# Altium schematic symbol library Capacitor - Ceramic - Sumsung.SchLib: 1421 symbols (part 5 of 8) (continued)
## CL21C331FBANNNC (continued)
CAP CER 330PF 50V NP0 0805; Part Number: CL21C331FBANNNC; Manufacturer: Samsung Electro-Mechanics America, Inc.; TemperatureRange: -55C ~ 125C; TemperatureCoefficient: C0G, NP0; Tolerance: 1%; Value: 330pF; PartId: 6011; Supplier 1: Digi-Key; Supplier Part Number 1: 1276-2642-2-ND; ComponentLink1Description: Datasheet; ComponentLink1URL: http://media.digikey.com/pdf/Data%20Sheets/Samsung%20PDFs/CL21C331FBANNNC_Spec.pdf; ComponentLink2Description: Digi-Key listing; ComponentLink2URL: http://digikey.com/product-detail/en/CL21C331FBANNNC/1276-2642-2-ND/3888300; Voltage: 50V; Price: 0.0705; Type: -; Device Package: 0805 (2012 Metric)
footprint CAP 0805/2012
pins: 1, 2

## CL21C331GBANNNC
designator C?, comment 330pF
CAP CER 330PF 50V NP0 0805; Part Number: CL21C331GBANNNC; Manufacturer: Samsung Electro-Mechanics America, Inc.; TemperatureRange: -55C ~ 125C; TemperatureCoefficient: C0G, NP0; Tolerance: 2%; Value: 330pF; PartId: 5944; Supplier 1: Digi-Key; Supplier Part Number 1: 1276-2643-2-ND; ComponentLink1Description: Datasheet; ComponentLink1URL: http://www.samsungsem.com/kr/support/product-search/mlcc/CL21C331GBANNNC.jsp; ComponentLink2Description: Digi-Key listing; ComponentLink2URL: http://digikey.com/product-detail/en/CL21C331GBANNNC/1276-2643-2-ND/3888301; Voltage: 50V; Price: 0.0457; Type: -; Device Package: 0805 (2012 Metric)
footprint CAP 0805/2012
pins: 1, 2

## CL21C331JBANNNC
designator C?, comment 330pF
CAP CER 330PF 50V NP0 0805; Part Number: CL21C331JBANNNC; Manufacturer: Samsung Electro-Mechanics America, Inc.; TemperatureRange: -55C ~ 125C; TemperatureCoefficient: C0G, NP0; Tolerance: 5%; Value: 330pF; PartId: 14024; Supplier 1: Digi-Key; Supplier Part Number 1: 1276-1189-2-ND; ComponentLink1Description: Datasheet; ComponentLink1URL: http://www.samsungsem.com/kr/support/product-search/mlcc/CL21C331JBANNNC.jsp; ComponentLink2Description: Digi-Key Listing; ComponentLink2URL: https://www.digikey.com/product-detail/en/samsung-electro-mechanics-america-inc/CL21C331JBANNNC/1276-1189-2-ND/3886847; Voltage: 50V; Price: 0.0115; Device Package: 0805 (2012 Metric)
footprint CAP 0805/2012
pins: 1, 2

## CL21C331JCANNNC
designator C?, comment 330pF
CAP CER 330PF 100V NP0 0805; Part Number: CL21C331JCANNNC; Manufacturer: Samsung Electro-Mechanics America, Inc.; TemperatureRange: -55C ~ 125C; TemperatureCoefficient: C0G, NP0; Tolerance: 5%; Value: 330pF; PartId: 5887; Supplier 1: Digi-Key; Supplier Part Number 1: 1276-2646-2-ND; ComponentLink1Description: Datasheet; ComponentLink1URL: http://www.samsungsem.com/kr/support/product-search/mlcc/CL21C331JCANNNC.jsp; ComponentLink2Description: Digi-Key listing; ComponentLink2URL: http://digikey.com/product-detail/en/CL21C331JCANNNC/1276-2646-2-ND/3888304; Voltage: 100V; Price: 0.0322; Type: -; Device Package: 0805 (2012 Metric)
footprint CAP 0805/2012
pins: 1, 2

## CL21C332JAFNNNE
designator C?, comment 3300pF
CAP CER 3300PF 25V NP0 0805; Part Number: CL21C332JAFNNNE; Manufacturer: Samsung Electro-Mechanics America, Inc.; TemperatureRange: -55C ~ 125C; TemperatureCoefficient: C0G, NP0; Tolerance: 5%; Value: 3300pF; PartId: 5940; Supplier 1: Digi-Key; Supplier Part Number 1: 1276-2997-2-ND; ComponentLink1Description: Datasheet; ComponentLink1URL: http://www.samsungsem.com/kr/support/product-search/mlcc/CL21C332JAFNNNE.jsp; ComponentLink2Description: Digi-Key listing; ComponentLink2URL: http://digikey.com/product-detail/en/CL21C332JAFNNNE/1276-2997-2-ND/3888655; Voltage: 25V; Price: 0.0442; Type: -; Device Package: 0805 (2012 Metric)
footprint CAP 0805/2012
pins: 1, 2

## CL21C360JBANNNC
designator C?, comment 36pF
CAP CER 36PF 50V NP0 0805; Part Number: CL21C360JBANNNC; Manufacturer: Samsung Electro-Mechanics America, Inc.; TemperatureRange: -55C ~ 125C; TemperatureCoefficient: C0G, NP0; Tolerance: 5%; Value: 36pF; PartId: 14252; Supplier 1: Digi-Key; Supplier Part Number 1: 1276-2649-2-ND; ComponentLink1Description: Datasheet; ComponentLink1URL: http://www.samsungsem.com/kr/support/product-search/mlcc/CL21C360JBANNNC.jsp; ComponentLink2Description: Digi-Key Listing; ComponentLink2URL: https://www.digikey.com/product-detail/en/samsung-electro-mechanics-america-inc/CL21C360JBANNNC/1276-2649-2-ND/3888307; Voltage: 50V; Price: 0.0113; Device Package: 0805 (2012 Metric)
footprint CAP 0805/2012
pins: 1, 2

## CL21C361JBANNNC
designator C?, comment 360pF
CAP CER 360PF 50V NP0 0805; Part Number: CL21C361JBANNNC; Manufacturer: Samsung Electro-Mechanics America, Inc.; TemperatureRange: -55C ~ 125C; TemperatureCoefficient: C0G, NP0; Tolerance: 5%; Value: 360pF; PartId: 5888; Supplier 1: Digi-Key; Supplier Part Number 1: 1276-2650-2-ND; ComponentLink1Description: Datasheet; ComponentLink1URL: http://www.samsungsem.com/kr/support/product-search/mlcc/CL21C361JBANNNC.jsp; ComponentLink2Description: Digi-Key listing; ComponentLink2URL: http://digikey.com/product-detail/en/CL21C361JBANNNC/1276-2650-2-ND/3888308; Voltage: 50V; Price: 0.0328; Type: -; Device Package: 0805 (2012 Metric)
footprint CAP 0805/2012
pins: 1, 2

## CL21C390JBANNNC
designator C?, comment 39pF
CAP CER 39PF 50V NP0 0805; Part Number: CL21C390JBANNNC; Manufacturer: Samsung Electro-Mechanics America, Inc.; TemperatureRange: -55C ~ 125C; TemperatureCoefficient: C0G, NP0; Tolerance: 5%; Value: 39pF; PartId: 5750; Supplier 1: Digi-Key; Supplier Part Number 1: 1276-1769-2-ND; ComponentLink1Description: Datasheet; ComponentLink1URL: http://www.samsungsem.com/kr/support/product-search/mlcc/CL21C390JBANNNC.jsp; ComponentLink2Description: Digi-Key listing; ComponentLink2URL: http://digikey.com/product-detail/en/CL21C390JBANNNC/1276-1769-2-ND/3887427; Voltage: 50V; Price: 0.0163; Type: -; Device Package: 0805 (2012 Metric)
footprint CAP 0805/2012
pins: 1, 2

## CL21C392JAANNNC
designator C?, comment 3900pF
CAP CER 3900PF 25V NP0 0805; Part Number: CL21C392JAANNNC; Manufacturer: Samsung Electro-Mechanics America, Inc.; TemperatureRange: -55C ~ 125C; TemperatureCoefficient: C0G, NP0; Tolerance: 5%; Value: 3900pF; PartId: 5969; Supplier 1: Digi-Key; Supplier Part Number 1: 1276-2654-2-ND; ComponentLink1Description: Datasheet; ComponentLink1URL: http://www.samsungsem.com/kr/support/product-search/mlcc/CL21C392JAANNNC.jsp; ComponentLink2Description: Digi-Key listing; ComponentLink2URL: http://digikey.com/product-detail/en/CL21C392JAANNNC/1276-2654-2-ND/3888312; Voltage: 25V; Price: 0.0578; Type: -; Device Package: 0805 (2012 Metric)
footprint CAP 0805/2012
pins: 1, 2

## CL21C430JBANNNC
designator C?, comment 43pF
CAP CER 43PF 50V NP0 0805; Part Number: CL21C430JBANNNC; Manufacturer: Samsung Electro-Mechanics America, Inc.; TemperatureRange: -55C ~ 125C; TemperatureCoefficient: C0G, NP0; Tolerance: 5%; Value: 43pF; PartId: 5670; Supplier 1: Digi-Key; Supplier Part Number 1: 1276-2657-2-ND; ComponentLink1Description: Datasheet; ComponentLink1URL: http://www.samsungsem.com/kr/support/product-search/mlcc/CL21C430JBANNNC.jsp; ComponentLink2Description: Digi-Key listing; ComponentLink2URL: http://digikey.com/product-detail/en/CL21C430JBANNNC/1276-2657-2-ND/3888315; Voltage: 50V; Price: 0.0054; Type: -; Device Package: 0805 (2012 Metric)
footprint CAP 0805/2012
pins: 1, 2

## CL21C431JBANNNC
designator C?, comment 430pF
CAP CER 430PF 50V NP0 0805; Part Number: CL21C431JBANNNC; Manufacturer: Samsung Electro-Mechanics America, Inc.; TemperatureRange: -55C ~ 125C; TemperatureCoefficient: C0G, NP0; Tolerance: 5%; Value: 430pF; PartId: 5902; Supplier 1: Digi-Key; Supplier Part Number 1: 1276-2659-2-ND; ComponentLink1Description: Datasheet; ComponentLink1URL: http://www.samsungsem.com/kr/support/product-search/mlcc/CL21C431JBANNNC.jsp; ComponentLink2Description: Digi-Key listing; ComponentLink2URL: http://digikey.com/product-detail/en/CL21C431JBANNNC/1276-2659-2-ND/3888317; Voltage: 50V; Price: 0.0351; Type: -; Device Package: 0805 (2012 Metric)
footprint CAP 0805/2012
pins: 1, 2

## CL21C470JBANNNC
designator C?, comment 47pF
CAP CER 47PF 50V NP0 0805; Part Number: CL21C470JBANNNC; Manufacturer: Samsung Electro-Mechanics America, Inc.; TemperatureRange: -55C ~ 125C; TemperatureCoefficient: C0G, NP0; Tolerance: 5%; Value: 47pF; PartId: 5710; Supplier 1: Digi-Key; Supplier Part Number 1: 1276-1156-2-ND; ComponentLink1Description: Datasheet; ComponentLink1URL: http://www.samsungsem.com/kr/support/product-search/mlcc/CL21C470JBANNNC.jsp; ComponentLink2Description: Digi-Key listing; ComponentLink2URL: http://digikey.com/product-detail/en/CL21C470JBANNNC/1276-1156-2-ND/3886814; Voltage: 50V; Price: 0.0132; Type: -; Device Package: 0805 (2012 Metric)
footprint CAP 0805/2012
pins: 1, 2

## CL21C470JCANNNC
designator C?, comment 47pF
CAP CER 47PF 100V NP0 0805; Part Number: CL21C470JCANNNC; Manufacturer: Samsung Electro-Mechanics America, Inc.; TemperatureRange: -55C ~ 125C; TemperatureCoefficient: C0G, NP0; Tolerance: 5%; Value: 47pF; PartId: 5821; Supplier 1: Digi-Key; Supplier Part Number 1: 1276-2662-2-ND; ComponentLink1Description: Datasheet; ComponentLink1URL: http://www.samsungsem.com/kr/support/product-search/mlcc/CL21C470JCANNNC.jsp; ComponentLink2Description: Digi-Key listing; ComponentLink2URL: http://digikey.com/product-detail/en/CL21C470JCANNNC/1276-2662-2-ND/3888320; Voltage: 100V; Price: 0.0214; Type: -; Device Package: 0805 (2012 Metric)
footprint CAP 0805/2012
pins: 1, 2

## CL21C471JBANNNC
designator C?, comment 470pF
CAP CER 470PF 50V NP0 0805; Part Number: CL21C471JBANNNC; Manufacturer: Samsung Electro-Mechanics America, Inc.; TemperatureRange: -55C ~ 125C; TemperatureCoefficient: C0G, NP0; Tolerance: 5%; Value: 470pF; PartId: 13839; Supplier 1: Digi-Key; Supplier Part Number 1: 1276-1121-2-ND; ComponentLink1Description: Datasheet; ComponentLink1URL: http://www.samsungsem.com/kr/support/product-search/mlcc/CL21C471JBANNNC.jsp; ComponentLink2Description: Digi-Key Listing; ComponentLink2URL: https://www.digikey.com/product-detail/en/samsung-electro-mechanics-america-inc/CL21C471JBANNNC/1276-1121-2-ND/3886779; Voltage: 50V; Price: 0.0154; Device Package: 0805 (2012 Metric)
footprint CAP 0805/2012
pins: 1, 2

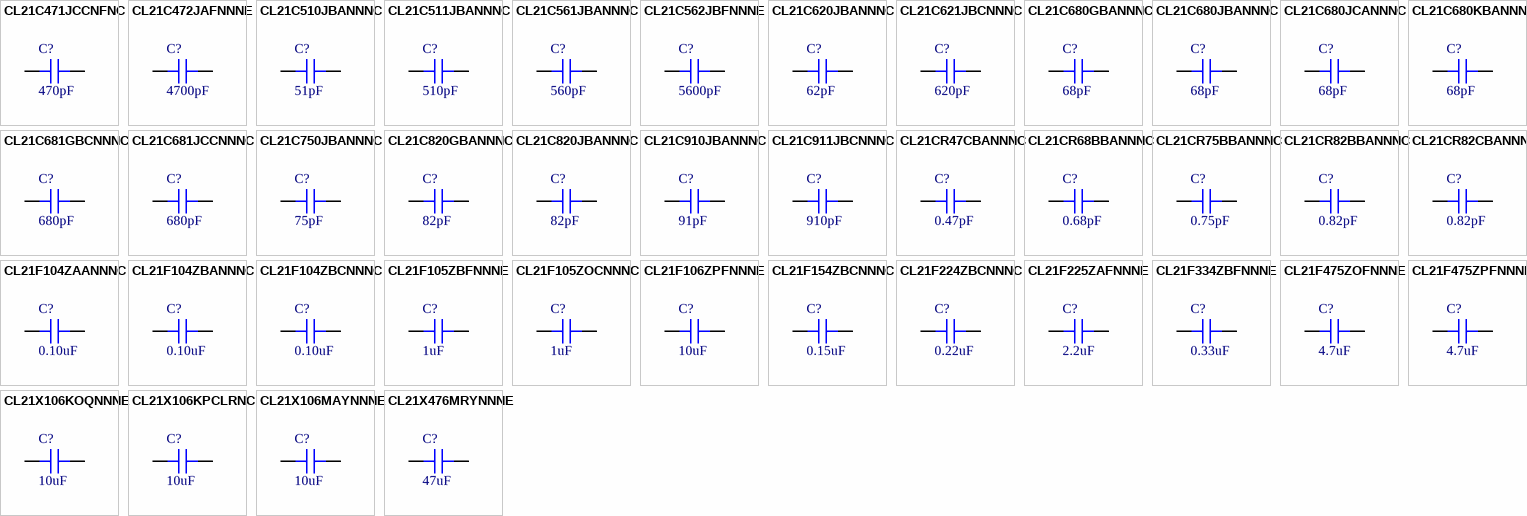
[diagram p23: symbols CL21C471JCCNFNC to CL21X476MRYNNNE]

## CL21C471JCCNFNC
designator C?, comment 470pF
CAP CER 470PF 100V NP0 0805; Part Number: CL21C471JCCNFNC; Manufacturer: Samsung Electro-Mechanics America, Inc.; TemperatureRange: -55C ~ 125C; TemperatureCoefficient: C0G, NP0; Tolerance: 5%; Value: 470pF; PartId: 5893; Supplier 1: Digi-Key; Supplier Part Number 1: 1276-2666-2-ND; ComponentLink1Description: Datasheet; ComponentLink1URL: http://www.samsungsem.com/kr/support/product-search/mlcc/CL21C471JCCNFNC.jsp; ComponentLink2Description: Digi-Key listing; ComponentLink2URL: http://digikey.com/product-detail/en/CL21C471JCCNFNC/1276-2666-2-ND/3888324; Voltage: 100V; Price: 0.0339; Type: -; Device Package: 0805 (2012 Metric)
footprint CAP 0805/2012
pins: 1, 2

## CL21C472JAFNNNE
designator C?, comment 4700pF
CAP CER 4700PF 25V NP0 0805; Part Number: CL21C472JAFNNNE; Manufacturer: Samsung Electro-Mechanics America, Inc.; TemperatureRange: -55C ~ 125C; TemperatureCoefficient: C0G, NP0; Tolerance: 5%; Value: 4700pF; PartId: 6016; Supplier 1: Digi-Key; Supplier Part Number 1: 1276-3001-2-ND; ComponentLink1Description: Datasheet; ComponentLink1URL: http://www.samsungsem.com/kr/support/product-search/mlcc/CL21C472JAFNNNE.jsp; ComponentLink2Description: Digi-Key listing; ComponentLink2URL: http://digikey.com/product-detail/en/CL21C472JAFNNNE/1276-3001-2-ND/3888659; Voltage: 25V; Price: 0.0712; Type: -; Device Package: 0805 (2012 Metric)
footprint CAP 0805/2012
pins: 1, 2

## CL21C510JBANNNC
designator C?, comment 51pF
CAP CER 51PF 50V NP0 0805; Part Number: CL21C510JBANNNC; Manufacturer: Samsung Electro-Mechanics America, Inc.; TemperatureRange: -55C ~ 125C; TemperatureCoefficient: C0G, NP0; Tolerance: 5%; Value: 51pF; PartId: 5764; Supplier 1: Digi-Key; Supplier Part Number 1: 1276-2670-2-ND; ComponentLink1Description: Datasheet; ComponentLink1URL: http://www.samsungsem.com/kr/support/product-search/mlcc/CL21C510JBANNNC.jsp; ComponentLink2Description: Digi-Key listing; ComponentLink2URL: http://digikey.com/product-detail/en/CL21C510JBANNNC/1276-2670-2-ND/3888328; Voltage: 50V; Price: 0.0163; Type: -; Device Package: 0805 (2012 Metric)
footprint CAP 0805/2012
pins: 1, 2

## CL21C511JBANNNC
designator C?, comment 510pF
CAP CER 510PF 50V NP0 0805; Part Number: CL21C511JBANNNC; Manufacturer: Samsung Electro-Mechanics America, Inc.; TemperatureRange: -55C ~ 125C; TemperatureCoefficient: C0G, NP0; Tolerance: 5%; Value: 510pF; PartId: 5924; Supplier 1: Digi-Key; Supplier Part Number 1: 1276-2671-2-ND; ComponentLink1Description: Datasheet; ComponentLink1URL: http://www.samsungsem.com/kr/support/product-search/mlcc/CL21C511JBANNNC.jsp; ComponentLink2Description: Digi-Key listing; ComponentLink2URL: http://digikey.com/product-detail/en/CL21C511JBANNNC/1276-2671-2-ND/3888329; Voltage: 50V; Price: 0.0406; Type: -; Device Package: 0805 (2012 Metric)
footprint CAP 0805/2012
pins: 1, 2

## CL21C561JBANNNC
designator C?, comment 560pF
CAP CER 560PF 50V NP0 0805; Part Number: CL21C561JBANNNC; Manufacturer: Samsung Electro-Mechanics America, Inc.; TemperatureRange: -55C ~ 125C; TemperatureCoefficient: C0G, NP0; Tolerance: 5%; Value: 560pF; PartId: 5869; Supplier 1: Digi-Key; Supplier Part Number 1: 1276-1834-2-ND; ComponentLink1Description: Datasheet; ComponentLink1URL: http://www.samsungsem.com/kr/support/product-search/mlcc/CL21C561JBANNNC.jsp; ComponentLink2Description: Digi-Key listing; ComponentLink2URL: http://digikey.com/product-detail/en/CL21C561JBANNNC/1276-1834-2-ND/3887492; Voltage: 50V; Price: 0.0289; Type: -; Device Package: 0805 (2012 Metric)
footprint CAP 0805/2012
pins: 1, 2

## CL21C562JBFNNNE
designator C?, comment 5600pF
CAP CER 5600PF 50V NP0 0805; Part Number: CL21C562JBFNNNE; Manufacturer: Samsung Electro-Mechanics America, Inc.; TemperatureRange: -55C ~ 125C; TemperatureCoefficient: C0G, NP0; Tolerance: 5%; Value: 5600pF; PartId: 6001; Supplier 1: Digi-Key; Supplier Part Number 1: 1276-3006-2-ND; ComponentLink1Description: Datasheet; ComponentLink1URL: http://www.samsungsem.com/kr/support/product-search/mlcc/CL21C562JBFNNNE.jsp; ComponentLink2Description: Digi-Key listing; ComponentLink2URL: http://digikey.com/product-detail/en/CL21C562JBFNNNE/1276-3006-2-ND/3888664; Voltage: 50V; Price: 0.0672; Type: -; Device Package: 0805 (2012 Metric)
footprint CAP 0805/2012
pins: 1, 2

## CL21C620JBANNNC
designator C?, comment 62pF
CAP CER 62PF 50V NP0 0805; Part Number: CL21C620JBANNNC; Manufacturer: Samsung Electro-Mechanics America, Inc.; TemperatureRange: -55C ~ 125C; TemperatureCoefficient: C0G, NP0; Tolerance: 5%; Value: 62pF; PartId: 5756; Supplier 1: Digi-Key; Supplier Part Number 1: 1276-1305-2-ND; ComponentLink1Description: Datasheet; ComponentLink1URL: http://www.samsungsem.com/kr/support/product-search/mlcc/CL21C620JBANNNC.jsp; ComponentLink2Description: Digi-Key listing; ComponentLink2URL: http://digikey.com/product-detail/en/CL21C620JBANNNC/1276-1305-2-ND/3886963; Voltage: 50V; Price: 0.0163; Type: -; Device Package: 0805 (2012 Metric)
footprint CAP 0805/2012
pins: 1, 2

## CL21C621JBCNNNC
designator C?, comment 620pF
CAP CER 620PF 50V NP0 0805; Part Number: CL21C621JBCNNNC; Manufacturer: Samsung Electro-Mechanics America, Inc.; TemperatureRange: -55C ~ 125C; TemperatureCoefficient: C0G, NP0; Tolerance: 5%; Value: 620pF; PartId: 5721; Supplier 1: Digi-Key; Supplier Part Number 1: 1276-2677-2-ND; ComponentLink1Description: Datasheet; ComponentLink1URL: http://www.samsungsem.com/kr/support/product-search/mlcc/CL21C621JBCNNNC.jsp; ComponentLink2Description: Digi-Key listing; ComponentLink2URL: http://digikey.com/product-detail/en/CL21C621JBCNNNC/1276-2677-2-ND/3888335; Voltage: 50V; Price: 0.0139; Type: -; Device Package: 0805 (2012 Metric)
footprint CAP 0805/2012
pins: 1, 2

## CL21C680GBANNNC
designator C?, comment 68pF
CAP CER 68PF 50V NP0 0805; Part Number: CL21C680GBANNNC; Manufacturer: Samsung Electro-Mechanics America, Inc.; TemperatureRange: -55C ~ 125C; TemperatureCoefficient: C0G, NP0; Tolerance: 2%; Value: 68pF; PartId: 5960; Supplier 1: Digi-Key; Supplier Part Number 1: 1276-2678-2-ND; ComponentLink1Description: Datasheet; ComponentLink1URL: http://www.samsungsem.com/kr/support/product-search/mlcc/CL21C680GBANNNC.jsp; ComponentLink2Description: Digi-Key listing; ComponentLink2URL: http://digikey.com/product-detail/en/CL21C680GBANNNC/1276-2678-2-ND/3888336; Voltage: 50V; Price: 0.0567; Type: -; Device Package: 0805 (2012 Metric)
footprint CAP 0805/2012
pins: 1, 2

## CL21C680JBANNNC
designator C?, comment 68pF
CAP CER 68PF 50V NP0 0805; Part Number: CL21C680JBANNNC; Manufacturer: Samsung Electro-Mechanics America, Inc.; TemperatureRange: -55C ~ 125C; TemperatureCoefficient: C0G, NP0; Tolerance: 5%; Value: 68pF; PartId: 5737; Supplier 1: Digi-Key; Supplier Part Number 1: 1276-1136-2-ND; ComponentLink1Description: Datasheet; ComponentLink1URL: http://www.samsungsem.com/kr/support/product-search/mlcc/CL21C680JBANNNC.jsp; ComponentLink2Description: Digi-Key listing; ComponentLink2URL: http://digikey.com/product-detail/en/CL21C680JBANNNC/1276-1136-2-ND/3886794; Voltage: 50V; Price: 0.0153; Type: -; Device Package: 0805 (2012 Metric)
footprint CAP 0805/2012
pins: 1, 2

## CL21C680JCANNNC
designator C?, comment 68pF
CAP CER 68PF 100V NP0 0805; Part Number: CL21C680JCANNNC; Manufacturer: Samsung Electro-Mechanics America, Inc.; TemperatureRange: -55C ~ 125C; TemperatureCoefficient: C0G, NP0; Tolerance: 5%; Value: 68pF; PartId: 5849; Supplier 1: Digi-Key; Supplier Part Number 1: 1276-2681-2-ND; ComponentLink1Description: Datasheet; ComponentLink1URL: http://www.samsungsem.com/kr/support/product-search/mlcc/CL21C680JCANNNC.jsp; ComponentLink2Description: Digi-Key listing; ComponentLink2URL: http://digikey.com/product-detail/en/CL21C680JCANNNC/1276-2681-2-ND/3888339; Voltage: 100V; Price: 0.0245; Type: -; Device Package: 0805 (2012 Metric)
footprint CAP 0805/2012
pins: 1, 2

## CL21C680KBANNNC
designator C?, comment 68pF
CAP CER 68PF 50V NP0 0805; Part Number: CL21C680KBANNNC; Manufacturer: Samsung Electro-Mechanics America, Inc.; TemperatureRange: -55C ~ 125C; TemperatureCoefficient: C0G, NP0; Tolerance: 10%; Value: 68pF; PartId: 5779; Supplier 1: Digi-Key; Supplier Part Number 1: 1276-2682-2-ND; ComponentLink1Description: Datasheet; ComponentLink1URL: http://www.samsungsem.com/kr/support/product-search/mlcc/CL21C680KBANNNC.jsp; ComponentLink2Description: Digi-Key listing; ComponentLink2URL: http://digikey.com/product-detail/en/CL21C680KBANNNC/1276-2682-2-ND/3888340; Voltage: 50V; Price: 0.0165; Type: -; Device Package: 0805 (2012 Metric)
footprint CAP 0805/2012
pins: 1, 2

## CL21C681GBCNNNC
designator C?, comment 680pF
CAP CER 680PF 50V NP0 0805; Part Number: CL21C681GBCNNNC; Manufacturer: Samsung Electro-Mechanics America, Inc.; TemperatureRange: -55C ~ 125C; TemperatureCoefficient: C0G, NP0; Tolerance: 2%; Value: 680pF; PartId: 6098; Supplier 1: Digi-Key; Supplier Part Number 1: 1276-2683-2-ND; ComponentLink1Description: Datasheet; ComponentLink1URL: http://www.samsungsem.com/kr/support/product-search/mlcc/CL21C681GBCNNNC.jsp; ComponentLink2Description: Digi-Key listing; ComponentLink2URL: http://digikey.com/product-detail/en/CL21C681GBCNNNC/1276-2683-2-ND/3888341; Voltage: 50V; Price: 0.1236; Type: -; Device Package: 0805 (2012 Metric)
footprint CAP 0805/2012
pins: 1, 2

## CL21C681JCCNNNC
designator C?, comment 680pF
CAP CER 680PF 100V NP0 0805; Part Number: CL21C681JCCNNNC; Manufacturer: Samsung Electro-Mechanics America, Inc.; TemperatureRange: -55C ~ 125C; TemperatureCoefficient: C0G, NP0; Tolerance: 5%; Value: 680pF; PartId: 5942; Supplier 1: Digi-Key; Supplier Part Number 1: 1276-1835-2-ND; ComponentLink1Description: Datasheet; ComponentLink1URL: http://www.samsungsem.com/kr/support/product-search/mlcc/CL21C681JCCNNNC.jsp; ComponentLink2Description: Digi-Key listing; ComponentLink2URL: http://digikey.com/product-detail/en/CL21C681JCCNNNC/1276-1835-2-ND/3887493; Voltage: 100V; Price: 0.0457; Type: -; Device Package: 0805 (2012 Metric)
footprint CAP 0805/2012
pins: 1, 2

## CL21C750JBANNNC
designator C?, comment 75pF
CAP CER 75PF 50V NP0 0805; Part Number: CL21C750JBANNNC; Manufacturer: Samsung Electro-Mechanics America, Inc.; TemperatureRange: -55C ~ 125C; TemperatureCoefficient: C0G, NP0; Tolerance: 5%; Value: 75pF; PartId: 5765; Supplier 1: Digi-Key; Supplier Part Number 1: 1276-2690-2-ND; ComponentLink1Description: Datasheet; ComponentLink1URL: http://www.samsungsem.com/kr/support/product-search/mlcc/CL21C750JBANNNC.jsp; ComponentLink2Description: Digi-Key listing; ComponentLink2URL: http://digikey.com/product-detail/en/CL21C750JBANNNC/1276-2690-2-ND/3888348; Voltage: 50V; Price: 0.0163; Type: -; Device Package: 0805 (2012 Metric)
footprint CAP 0805/2012
pins: 1, 2

## CL21C820GBANNNC
designator C?, comment 82pF
CAP CER 82PF 50V NP0 0805; Part Number: CL21C820GBANNNC; Manufacturer: Samsung Electro-Mechanics America, Inc.; TemperatureRange: -55C ~ 125C; TemperatureCoefficient: C0G, NP0; Tolerance: 2%; Value: 82pF; PartId: 5999; Supplier 1: Digi-Key; Supplier Part Number 1: 1276-2694-2-ND; ComponentLink1Description: Datasheet; ComponentLink1URL: http://www.samsungsem.com/kr/support/product-search/mlcc/CL21C820GBANNNC.jsp; ComponentLink2Description: Digi-Key listing; ComponentLink2URL: http://digikey.com/product-detail/en/CL21C820GBANNNC/1276-2694-2-ND/3888352; Voltage: 50V; Price: 0.067; Type: -; Device Package: 0805 (2012 Metric)
footprint CAP 0805/2012
pins: 1, 2

## CL21C820JBANNNC
designator C?, comment 82pF
CAP CER 82PF 50V NP0 0805; Part Number: CL21C820JBANNNC; Manufacturer: Samsung Electro-Mechanics America, Inc.; TemperatureRange: -55C ~ 125C; TemperatureCoefficient: C0G, NP0; Tolerance: 5%; Value: 82pF; PartId: 5749; Supplier 1: Digi-Key; Supplier Part Number 1: 1276-1802-2-ND; ComponentLink1Description: Datasheet; ComponentLink1URL: http://www.samsungsem.com/kr/support/product-search/mlcc/CL21C820JBANNNC.jsp; ComponentLink2Description: Digi-Key listing; ComponentLink2URL: http://digikey.com/product-detail/en/CL21C820JBANNNC/1276-1802-2-ND/3887460; Voltage: 50V; Price: 0.0163; Type: -; Device Package: 0805 (2012 Metric)
footprint CAP 0805/2012
pins: 1, 2

## CL21C910JBANNNC
designator C?, comment 91pF
CAP CER 91PF 50V NP0 0805; Part Number: CL21C910JBANNNC; Manufacturer: Samsung Electro-Mechanics America, Inc.; TemperatureRange: -55C ~ 125C; TemperatureCoefficient: C0G, NP0; Tolerance: 5%; Value: 91pF; PartId: 5760; Supplier 1: Digi-Key; Supplier Part Number 1: 1276-1836-2-ND; ComponentLink1Description: Datasheet; ComponentLink1URL: http://www.samsungsem.com/kr/support/product-search/mlcc/CL21C910JBANNNC.jsp; ComponentLink2Description: Digi-Key listing; ComponentLink2URL: http://digikey.com/product-detail/en/CL21C910JBANNNC/1276-1836-2-ND/3887494; Voltage: 50V; Price: 0.0163; Type: -; Device Package: 0805 (2012 Metric)
footprint CAP 0805/2012
pins: 1, 2

## CL21C911JBCNNNC
designator C?, comment 910pF
CAP CER 910PF 50V NP0 0805; Part Number: CL21C911JBCNNNC; Manufacturer: Samsung Electro-Mechanics America, Inc.; TemperatureRange: -55C ~ 125C; TemperatureCoefficient: C0G, NP0; Tolerance: 5%; Value: 910pF; PartId: 5936; Supplier 1: Digi-Key; Supplier Part Number 1: 1276-2698-2-ND; ComponentLink1Description: Datasheet; ComponentLink1URL: http://www.samsungsem.com/kr/support/product-search/mlcc/CL21C911JBCNNNC.jsp; ComponentLink2Description: Digi-Key listing; ComponentLink2URL: http://digikey.com/product-detail/en/CL21C911JBCNNNC/1276-2698-2-ND/3888356; Voltage: 50V; Price: 0.0435; Type: -; Device Package: 0805 (2012 Metric)
footprint CAP 0805/2012
pins: 1, 2

## CL21CR47CBANNNC
designator C?, comment 0.47pF
CAP CER 0.47PF 50V NP0 0805; Part Number: CL21CR47CBANNNC; Manufacturer: Samsung Electro-Mechanics America, Inc.; TemperatureRange: -55C ~ 125C; TemperatureCoefficient: C0G, NP0; Tolerance: 0.25pF; Value: 0.47pF; PartId: 5676; Supplier 1: Digi-Key; Supplier Part Number 1: 1276-2700-2-ND; ComponentLink1Description: Datasheet; ComponentLink1URL: http://media.digikey.com/pdf/Data%20Sheets/Samsung%20PDFs/CL21CR47CBANNNC_Spec.pdf; ComponentLink2Description: Digi-Key listing; ComponentLink2URL: http://digikey.com/product-detail/en/CL21CR47CBANNNC/1276-2700-2-ND/3888358; Voltage: 50V; Price: 0.0054; Type: -; Device Package: 0805 (2012 Metric)
footprint CAP 0805/2012
pins: 1, 2

## CL21CR68BBANNNC
designator C?, comment 0.68pF
CAP CER 0.68PF 50V NP0 0805; Part Number: CL21CR68BBANNNC; Manufacturer: Samsung Electro-Mechanics America, Inc.; TemperatureRange: -55C ~ 125C; TemperatureCoefficient: C0G, NP0; Tolerance: 0.1pF; Value: 0.68pF; PartId: 5692; Supplier 1: Digi-Key; Supplier Part Number 1: 1276-2701-2-ND; ComponentLink1Description: Datasheet; ComponentLink1URL: http://media.digikey.com/pdf/Data%20Sheets/Samsung%20PDFs/CL21CR68BBANNNC_Spec.pdf; ComponentLink2Description: Digi-Key listing; ComponentLink2URL: http://digikey.com/product-detail/en/CL21CR68BBANNNC/1276-2701-2-ND/3888359; Voltage: 50V; Price: 0.0078; Type: -; Device Package: 0805 (2012 Metric)
footprint CAP 0805/2012
pins: 1, 2

## CL21CR75BBANNNC
designator C?, comment 0.75pF
CAP CER 0.75PF 50V NP0 0805; Part Number: CL21CR75BBANNNC; Manufacturer: Samsung Electro-Mechanics America, Inc.; TemperatureRange: -55C ~ 125C; TemperatureCoefficient: C0G, NP0; Tolerance: 0.1pF; Value: 0.75pF; PartId: 5690; Supplier 1: Digi-Key; Supplier Part Number 1: 1276-2702-2-ND; ComponentLink1Description: Datasheet; ComponentLink1URL: http://media.digikey.com/pdf/Data%20Sheets/Samsung%20PDFs/CL21CR75BBANNNC_Spec.pdf; ComponentLink2Description: Digi-Key listing; ComponentLink2URL: http://digikey.com/product-detail/en/CL21CR75BBANNNC/1276-2702-2-ND/3888360; Voltage: 50V; Price: 0.0073; Type: -; Device Package: 0805 (2012 Metric)
footprint CAP 0805/2012
pins: 1, 2

## CL21CR82BBANNNC
designator C?, comment 0.82pF
CAP CER 0.82PF 50V NP0 0805; Part Number: CL21CR82BBANNNC; Manufacturer: Samsung Electro-Mechanics America, Inc.; TemperatureRange: -55C ~ 125C; TemperatureCoefficient: C0G, NP0; Tolerance: 0.1pF; Value: 0.82pF; PartId: 5691; Supplier 1: Digi-Key; Supplier Part Number 1: 1276-2703-2-ND; ComponentLink1Description: Datasheet; ComponentLink1URL: http://media.digikey.com/pdf/Data%20Sheets/Samsung%20PDFs/CL21CR82BBANNNC_Spec.pdf; ComponentLink2Description: Digi-Key listing; ComponentLink2URL: http://digikey.com/product-detail/en/CL21CR82BBANNNC/1276-2703-2-ND/3888361; Voltage: 50V; Price: 0.0075; Type: -; Device Package: 0805 (2012 Metric)
footprint CAP 0805/2012
pins: 1, 2

## CL21CR82CBANNNC
designator C?, comment 0.82pF
CAP CER 0.82PF 50V NP0 0805; Part Number: CL21CR82CBANNNC; Manufacturer: Samsung Electro-Mechanics America, Inc.; TemperatureRange: -55C ~ 125C; TemperatureCoefficient: C0G, NP0; Tolerance: 0.25pF; Value: 0.82pF; PartId: 5680; Supplier 1: Digi-Key; Supplier Part Number 1: 1276-2704-2-ND; ComponentLink1Description: Datasheet; ComponentLink1URL: http://media.digikey.com/pdf/Data%20Sheets/Samsung%20PDFs/CL21CR82CBANNNC_Spec.pdf; ComponentLink2Description: Digi-Key listing; ComponentLink2URL: http://digikey.com/product-detail/en/CL21CR82CBANNNC/1276-2704-2-ND/3888362; Voltage: 50V; Price: 0.0058; Type: -; Device Package: 0805 (2012 Metric)
footprint CAP 0805/2012
pins: 1, 2

## CL21F104ZAANNNC
designator C?, comment 0.10uF
CAP CER 0.1UF 25V Y5V 0805; Part Number: CL21F104ZAANNNC; Manufacturer: Samsung Electro-Mechanics America, Inc.; TemperatureRange: -30C ~ 85C; TemperatureCoefficient: Y5V (F); Tolerance: -20%, +80%; Value: 0.10uF; PartId: 13999; Supplier 1: Digi-Key; Supplier Part Number 1: 1276-1286-2-ND; ComponentLink1Description: Datasheet; ComponentLink1URL: http://www.samsungsem.com/kr/support/product-search/mlcc/CL21F104ZAANNNC.jsp; ComponentLink2Description: Digi-Key Listing; ComponentLink2URL: https://www.digikey.com/product-detail/en/samsung-electro-mechanics-america-inc/CL21F104ZAANNNC/1276-1286-2-ND/3886944; Voltage: 25V; Price: 0.006; Device Package: 0805 (2012 Metric)
footprint CAP 0805/2012
pins: 1, 2

## CL21F104ZBANNNC
designator C?, comment 0.10uF
CAP CER 0.1UF 50V Y5V 0805; Part Number: CL21F104ZBANNNC; Manufacturer: Samsung Electro-Mechanics America, Inc.; TemperatureRange: -30C ~ 85C; TemperatureCoefficient: Y5V (F); Tolerance: -20%, +80%; Value: 0.10uF; PartId: 14000; Supplier 1: Digi-Key; Supplier Part Number 1: 1276-1114-2-ND; ComponentLink1Description: Datasheet; ComponentLink1URL: http://www.samsungsem.com/kr/support/product-search/mlcc/CL21F104ZBANNNC.jsp; ComponentLink2Description: Digi-Key Listing; ComponentLink2URL: https://www.digikey.com/product-detail/en/samsung-electro-mechanics-america-inc/CL21F104ZBANNNC/1276-1114-2-ND/3886772; Voltage: 50V; Price: 0.006; Device Package: 0805 (2012 Metric)
footprint CAP 0805/2012
pins: 1, 2

## CL21F104ZBCNNNC
designator C?, comment 0.10uF
CAP CER 0.1UF 50V Y5V 0805; Part Number: CL21F104ZBCNNNC; Manufacturer: Samsung Electro-Mechanics America, Inc.; TemperatureRange: -30C ~ 85C; TemperatureCoefficient: Y5V (F); Tolerance: -20%, +80%; Value: 0.10uF; PartId: 13707; Supplier 1: Digi-Key; Supplier Part Number 1: 1276-1007-2-ND; ComponentLink1Description: Datasheet; ComponentLink1URL: http://www.samsungsem.com/kr/support/product-search/mlcc/CL21F104ZBCNNNC.jsp; ComponentLink2Description: Digi-Key Listing; ComponentLink2URL: https://www.digikey.com/product-detail/en/samsung-electro-mechanics-america-inc/CL21F104ZBCNNNC/1276-1007-2-ND/3886665; Voltage: 50V; Price: 0.006; Device Package: 0805 (2012 Metric)
footprint CAP 0805/2012
pins: 1, 2

## CL21F105ZBFNNNE
designator C?, comment 1uF
CAP CER 1UF 50V Y5V 0805; Part Number: CL21F105ZBFNNNE; Manufacturer: Samsung Electro-Mechanics America, Inc.; TemperatureRange: -30C ~ 85C; TemperatureCoefficient: Y5V (F); Tolerance: -20%, +80%; Value: 1uF; PartId: 13797; Supplier 1: Digi-Key; Supplier Part Number 1: 1276-3010-2-ND; ComponentLink1Description: Datasheet; ComponentLink1URL: http://www.samsungsem.com/kr/support/product-search/mlcc/CL21F105ZBFNNNE.jsp; ComponentLink2Description: Digi-Key Listing; ComponentLink2URL: https://www.digikey.com/product-detail/en/samsung-electro-mechanics-america-inc/CL21F105ZBFNNNE/1276-3010-2-ND/3888668; Voltage: 50V; Price: 0.0172; Device Package: 0805 (2012 Metric)
footprint CAP 0805/2012
pins: 1, 2

## CL21F105ZOCNNNC
designator C?, comment 1uF
CAP CER 1UF 16V Y5V 0805; Part Number: CL21F105ZOCNNNC; Manufacturer: Samsung Electro-Mechanics America, Inc.; TemperatureRange: -30C ~ 85C; TemperatureCoefficient: Y5V (F); Tolerance: -20%, +80%; Value: 1uF; PartId: 14027; Supplier 1: Digi-Key; Supplier Part Number 1: 1276-1246-2-ND; ComponentLink1Description: Datasheet; ComponentLink1URL: http://www.samsungsem.com/kr/support/product-search/mlcc/CL21F105ZOCNNNC.jsp; ComponentLink2Description: Digi-Key Listing; ComponentLink2URL: https://www.digikey.com/product-detail/en/samsung-electro-mechanics-america-inc/CL21F105ZOCNNNC/1276-1246-2-ND/3886904; Voltage: 16V; Price: 0.0082; Device Package: 0805 (2012 Metric)
footprint CAP 0805/2012
pins: 1, 2

## CL21F106ZPFNNNE
designator C?, comment 10uF
CAP CER 10UF 10V Y5V 0805; Part Number: CL21F106ZPFNNNE; Manufacturer: Samsung Electro-Mechanics America, Inc.; TemperatureRange: -30C ~ 85C; TemperatureCoefficient: Y5V (F); Tolerance: -20%, +80%; Value: 10uF; PartId: 13911; Supplier 1: Digi-Key; Supplier Part Number 1: 1276-3012-2-ND; ComponentLink1Description: Datasheet; ComponentLink1URL: http://www.samsungsem.com/kr/support/product-search/mlcc/CL21F106ZPFNNNE.jsp; ComponentLink2Description: Digi-Key Listing; ComponentLink2URL: https://www.digikey.com/product-detail/en/samsung-electro-mechanics-america-inc/CL21F106ZPFNNNE/1276-3012-2-ND/3888670; Voltage: 10V; Price: 0.0263; Device Package: 0805 (2012 Metric)
footprint CAP 0805/2012
pins: 1, 2

## CL21F154ZBCNNNC
designator C?, comment 0.15uF
CAP CER 0.15UF 50V Y5V 0805; Part Number: CL21F154ZBCNNNC; Manufacturer: Samsung Electro-Mechanics America, Inc.; TemperatureRange: -30C ~ 85C; TemperatureCoefficient: Y5V (F); Tolerance: -20%, +80%; Value: 0.15uF; PartId: 14028; Supplier 1: Digi-Key; Supplier Part Number 1: 1276-2708-2-ND; ComponentLink1Description: Datasheet; ComponentLink1URL: http://www.samsungsem.com/kr/support/product-search/mlcc/CL21F154ZBCNNNC.jsp; ComponentLink2Description: Digi-Key Listing; ComponentLink2URL: https://www.digikey.com/product-detail/en/samsung-electro-mechanics-america-inc/CL21F154ZBCNNNC/1276-2708-2-ND/3888366; Voltage: 50V; Price: 0.0042; Device Package: 0805 (2012 Metric)
footprint CAP 0805/2012
pins: 1, 2

## CL21F224ZBCNNNC
designator C?, comment 0.22uF
CAP CER 0.22UF 50V Y5V 0805; Part Number: CL21F224ZBCNNNC; Manufacturer: Samsung Electro-Mechanics America, Inc.; TemperatureRange: -30C ~ 85C; TemperatureCoefficient: Y5V (F); Tolerance: -20%, +80%; Value: 0.22uF; PartId: 14055; Supplier 1: Digi-Key; Supplier Part Number 1: 1276-2711-2-ND; ComponentLink1Description: Datasheet; ComponentLink1URL: http://www.samsungsem.com/kr/support/product-search/mlcc/CL21F224ZBCNNNC.jsp; ComponentLink2Description: Digi-Key Listing; ComponentLink2URL: https://www.digikey.com/product-detail/en/samsung-electro-mechanics-america-inc/CL21F224ZBCNNNC/1276-2711-2-ND/3888369; Voltage: 50V; Price: 0.0172; Device Package: 0805 (2012 Metric)
footprint CAP 0805/2012
pins: 1, 2

## CL21F225ZAFNNNE
designator C?, comment 2.2uF
CAP CER 2.2UF 25V Y5V 0805; Part Number: CL21F225ZAFNNNE; Manufacturer: Samsung Electro-Mechanics America, Inc.; TemperatureRange: -30C ~ 85C; TemperatureCoefficient: Y5V (F); Tolerance: -20%, +80%; Value: 2.2uF; PartId: 14054; Supplier 1: Digi-Key; Supplier Part Number 1: 1276-2874-2-ND; ComponentLink1Description: Datasheet; ComponentLink1URL: http://www.samsungsem.com/kr/support/product-search/mlcc/CL21F225ZAFNNNE.jsp; ComponentLink2Description: Digi-Key Listing; ComponentLink2URL: https://www.digikey.com/product-detail/en/samsung-electro-mechanics-america-inc/CL21F225ZAFNNNE/1276-2874-2-ND/3888532; Voltage: 25V; Price: 0.0205; Device Package: 0805 (2012 Metric)
footprint CAP 0805/2012
pins: 1, 2